# Altium footprint library Generic Footprint.PcbLib: 160 footprints (part 14 of 20) (continued)
## Symbol_FCC-Logo-1.5x1mm_silkscreen [mm] (continued)
1(0.677,0.644) 1(0.677,0.648) 1(0.677,0.649) 1(0.677,0.651) 1(0.677,0.894) 1(0.677,0.896) 1(0.677,0.898) 1(0.677,0.899) 1(0.678,0.178) 1(0.678,0.18) 1(0.678,0.422) 1(0.678,0.423) 1(0.678,0.427) 1(0.678,0.428) 1(0.678,0.43) 1(0.678,0.433) 1(0.678,0.435) 1(0.678,0.437) 1(0.678,0.639) 1(0.678,0.641) 1(0.678,0.643) 1(0.678,0.644) 1(0.678,0.648) 1(0.678,0.649) 1(0.678,0.653) 1(0.678,0.654) 1(0.678,0.656) 1(0.678,0.898) 1(0.678,0.899) 1(0.678,0.901) 1(0.68,0.175) 1(0.68,0.177) 1(0.68,0.178) 1(0.68,0.416) 1(0.68,0.418) 1(0.68,0.422) 1(0.68,0.423) 1(0.68,0.427) 1(0.68,0.428) 1(0.68,0.43) 1(0.68,0.648) 1(0.68,0.649) 1(0.68,0.653) 1(0.68,0.654) 1(0.68,0.656) 1(0.68,0.658) 1(0.68,0.659) 1(0.68,0.661) 1(0.68,0.663) 1(0.68,0.899) 1(0.68,0.903) 1(0.682,0.172) 1(0.682,0.173) 1(0.682,0.175) 1(0.682,0.177) 1(0.682,0.416) 1(0.682,0.418) 1(0.682,0.42) 1(0.682,0.422) 1(0.682,0.423) 1(0.682,0.653) 1(0.682,0.654) 1(0.682,0.656) 1(0.682,0.659) 1(0.682,0.661) 1(0.682,0.663) 1(0.682,0.904) 1(0.683,0.17) 1(0.683,0.175) 1(0.683,0.415) 1(0.683,0.416) 1(0.683,0.661) 1(0.683,0.906) 1(0.685,0.168) 1(0.685,0.172) 1(0.685,0.403) 1(0.685,0.418) 1(0.685,0.659) 1(0.685,0.663) 1(0.685,0.675) 1(0.685,0.908) 1(0.687,0.17) 1(0.687,0.172) 1(0.687,0.396) 1(0.687,0.398) 1(0.687,0.399) 1(0.687,0.403) 1(0.687,0.408) 1(0.687,0.41) 1(0.687,0.411) 1(0.687,0.413) 1(0.687,0.665) 1(0.687,0.666) 1(0.687,0.668) 1(0.687,0.675) 1(0.687,0.678) 1(0.687,0.68) 1(0.687,0.682) 1(0.687,0.908) 1(0.687,0.909) 1(0.688,0.166) 1(0.688,0.168) 1(0.688,0.17) 1(0.688,0.393) 1(0.688,0.396) 1(0.688,0.398) 1(0.688,0.399) 1(0.688,0.403) 1(0.688,0.405) 1(0.688,0.406) 1(0.688,0.67) 1(0.688,0.671) 1(0.688,0.673) 1(0.688,0.675) 1(0.688,0.678) 1(0.688,0.68) 1(0.688,0.682) 1(0.688,0.683) 1(0.688,0.685) 1(0.688,0.908) 1(0.688,0.909) 1(0.688,0.911) 1(0.69,0.163) 1(0.69,0.165) 1(0.69,0.166) 1(0.69,0.168) 1(0.69,0.388) 1(0.69,0.389) 1(0.69,0.391) 1(0.69,0.393) 1(0.69,0.396) 1(0.69,0.399) 1(0.69,0.401) 1(0.69,0.677) 1(0.69,0.678) 1(0.69,0.682) 1(0.69,0.683) 1(0.69,0.685) 1(0.69,0.687) 1(0.69,0.688) 1(0.69,0.909) 1(0.69,0.911) 1(0.69,0.913) 1(0.69,0.915) 1(0.692,0.165) 1(0.692,0.393) 1(0.692,0.394) 1(0.692,0.398) 1(0.692,0.68) 1(0.692,0.683) 1(0.692,0.69) 1(0.692,0.911) 1(0.693,0.163) 1(0.693,0.165) 1(0.693,0.166) 1(0.693,0.382) 1(0.693,0.384) 1(0.693,0.386) 1(0.693,0.389) 1(0.693,0.685) 1(0.693,0.688) 1(0.693,0.692) 1(0.693,0.694) 1(0.693,0.695) 1(0.693,0.916) 1(0.695,0.161) 1(0.695,0.381) 1(0.695,0.384) 1(0.695,0.389) 1(0.695,0.688) 1(0.695,0.694) 1(0.695,0.695) 1(0.695,0.697) 1(0.695,0.699) 1(0.695,0.918) 1(0.697,0.16) 1(0.697,0.161) 1(0.697,0.163) 1(0.697,0.377) 1(0.697,0.381) 1(0.697,0.384) 1(0.697,0.694) 1(0.697,0.695) 1(0.697,0.697) 1(0.697,0.699) 1(0.697,0.7) 1(0.699,0.158) 1(0.699,0.16) 1(0.699,0.161) 1(0.699,0.377) 1(0.699,0.379) 1(0.699,0.381) 1(0.699,0.697) 1(0.699,0.699) 1(0.699,0.7) 1(0.699,0.92) 1(0.7,0.156) 1(0.7,0.158) 1(0.7,0.16) 1(0.7,0.369) 1(0.7,0.374) 1(0.7,0.376) 1(0.7,0.377) 1(0.7,0.7) 1(0.7,0.709) 1(0.7,0.921) 1(0.702,0.153) 1(0.702,0.155) 1(0.702,0.156) 1(0.702,0.369) 1(0.702,0.702) 1(0.702,0.704) 1(0.702,0.709) 1(0.702,0.712) 1(0.702,0.714) 1(0.702,0.92) 1(0.702,0.921) 1(0.702,0.923) 1(0.704,0.151) 1(0.704,0.155) 1(0.704,0.156) 1(0.704,0.158) 1(0.704,0.362) 1(0.704,0.364) 1(0.704,0.369) 1(0.704,0.371) 1(0.704,0.372) 1(0.704,0.705) 1(0.704,0.707) 1(0.704,0.709) 1(0.704,0.712) 1(0.704,0.716) 1(0.704,0.717) 1(0.704,0.92) 1(0.704,0.921) 1(0.704,0.923) 1(0.704,0.925) 1(0.705,0.153) 1(0.705,0.155) 1(0.705,0.359) 1(0.705,0.36) 1(0.705,0.362) 1(0.705,0.364) 1(0.705,0.365) 1(0.705,0.367) 1(0.705,0.711) 1(0.705,0.712) 1(0.705,0.714) 1(0.705,0.716) 1(0.705,0.717) 1(0.705,0.719) 1(0.705,0.923) 1(0.705,0.925) 1(0.705,0.926) 1(0.707,0.15) 1(0.707,0.151) 1(0.707,0.153) 1(0.707,0.354) 1(0.707,0.355) 1(0.707,0.357) 1(0.707,0.359) 1(0.707,0.36) 1(0.707,0.362) 1(0.707,0.714) 1(0.707,0.716) 1(0.707,0.717) 1(0.707,0.719) 1(0.707,0.721) 1(0.707,0.722) 1(0.707,0.925) 1(0.707,0.928) 1(0.709,0.36) 1(0.709,0.364) 1(0.709,0.719) 1(0.709,0.721) 1(0.709,0.724) 1(0.709,0.926) 1(0.709,0.93) 1(0.711,0.148) 1(0.711,0.151) 1(0.711,0.35) 1(0.711,0.352) 1(0.711,0.355) 1(0.711,0.359) 1(0.711,0.721) 1(0.711,0.722) 1(0.711,0.726) 1(0.711,0.728) 1(0.711,0.926) 1(0.711,0.932) 1(0.712,0.146) 1(0.712,0.148) 1(0.712,0.15) 1(0.712,0.35) 1(0.712,0.355) 1(0.712,0.722) 1(0.712,0.726) 1(0.712,0.728) 1(0.712,0.729) 1(0.712,0.731) 1(0.714,0.144) 1(0.714,0.146) 1(0.714,0.15) 1(0.714,0.345) 1(0.714,0.35) 1(0.714,0.726) 1(0.714,0.728) 1(0.714,0.729) 1(0.714,0.731) 1(0.714,0.933) 1(0.716,0.143) 1(0.716,0.144) 1(0.716,0.146) 1(0.716,0.148) 1(0.716,0.345) 1(0.716,0.348) 1(0.716,0.729) 1(0.716,0.731) 1(0.716,0.933) 1(0.716,0.935) 1(0.717,0.141) 1(0.717,0.143) 1(0.717,0.338) 1(0.717,0.34) 1(0.717,0.347) 1(0.717,0.935) 1(0.717,0.937) 1(0.719,0.139) 1(0.719,0.144) 1(0.719,0.336) 1(0.719,0.34) 1(0.719,0.343) 1(0.719,0.345) 1(0.719,0.733) 1(0.719,0.734) 1(0.719,0.738) 1(0.719,0.739) 1(0.719,0.741) 1(0.719,0.933) 1(0.721,0.143) 1(0.721,0.333) 1(0.721,0.335) 1(0.721,0.336) 1(0.721,0.338) 1(0.721,0.34) 1(0.721,0.342) 1(0.721,0.736) 1(0.721,0.739) 1(0.721,0.741) 1(0.721,0.743) 1(0.721,0.744) 1(0.721,0.746) 1(0.722,0.136) 1(0.722,0.138) 1(0.722,0.139) 1(0.722,0.141) 1(0.722,0.33) 1(0.722,0.331) 1(0.722,0.333) 1(0.722,0.336) 1(0.722,0.338) 1(0.722,0.739) 1(0.722,0.741) 1(0.722,0.743) 1(0.722,0.744) 1(0.722,0.748) 1(0.722,0.935) 1(0.722,0.937) 1(0.722,0.94) 1(0.724,0.138) 1(0.724,0.139) 1(0.724,0.141) 1(0.724,0.328) 1(0.724,0.331) 1(0.724,0.333) 1(0.724,0.743) 1(0.724,0.744) 1(0.724,0.748) 1(0.724,0.75) 1(0.724,0.937) 1(0.724,0.938) 1(0.724,0.94) 1(0.724,0.942) 1(0.726,0.134) 1(0.726,0.136) 1(0.726,0.942) 1(0.726,0.943) 1(0.727,0.138) 1(0.727,0.328) 1(0.727,0.331) 1(0.727,0.748) 1(0.727,0.75) 1(0.727,0.94) 1(0.727,0.945) 1(0.729,0.132) 1(0.729,0.136) 1(0.729,0.328) 1(0.729,0.515) 1(0.729,0.517) 1(0.729,0.518) 1(0.729,0.52) 1(0.729,0.522) 1(0.729,0.524) 1(0.729,0.525) 1(0.729,0.527) 1(0.729,0.529) 1(0.729,0.53) 1(0.729,0.532) 1(0.729,0.534) 1(0.729,0.535) 1(0.729,0.537) 1(0.729,0.539) 1(0.729,0.54) 1(0.729,0.542) 1(0.729,0.544) 1(0.729,0.546) 1(0.729,0.547) 1(0.729,0.549) 1(0.729,0.551) 1(0.729,0.552) 1(0.729,0.554) 1(0.729,0.556) 1(0.729,0.558) 1(0.729,0.559) 1(0.729,0.561) 1(0.729,0.563) 1(0.729,0.75) 1(0.729,0.751) 1(0.729,0.753) 1(0.729,0.756) 1(0.729,0.942) 1(0.729,0.943) 1(0.731,0.131) 1(0.731,0.132) 1(0.731,0.134) 1(0.731,0.32) 1(0.731,0.323) 1(0.731,0.325) 1(0.731,0.326) 1(0.731,0.498) 1(0.731,0.5) 1(0.731,0.501) 1(0.731,0.503) 1(0.731,0.505) 1(0.731,0.507) 1(0.731,0.508) 1(0.731,0.51) 1(0.731,0.515) 1(0.731,0.517) 1(0.731,0.518) 1(0.731,0.52) 1(0.731,0.522) 1(0.731,0.524) 1(0.731,0.525) 1(0.731,0.527) 1(0.731,0.529) 1(0.731,0.53) 1(0.731,0.532) 1(0.731,0.534) 1(0.731,0.535) 1(0.731,0.537) 1(0.731,0.539) 1(0.731,0.54) 1(0.731,0.542) 1(0.731,0.544) 1(0.731,0.546) 1(0.731,0.547) 1(0.731,0.549) 1(0.731,0.551) 1(0.731,0.552) 1(0.731,0.554) 1(0.731,0.556) 1(0.731,0.558) 1(0.731,0.559) 1(0.731,0.561) 1(0.731,0.563) 1(0.731,0.568) 1(0.731,0.569) 1(0.731,0.571) 1(0.731,0.573) 1(0.731,0.575) 1(0.731,0.576) 1(0.731,0.578) 1(0.731,0.58) 1(0.731,0.756) 1(0.731,0.758) 1(0.731,0.943) 1(0.731,0.947) 1(0.733,0.127) 1(0.733,0.129) 1(0.733,0.131) 1(0.733,0.134) 1(0.733,0.32) 1(0.733,0.486) 1(0.733,0.488) 1(0.733,0.49) 1(0.733,0.491) 1(0.733,0.493) 1(0.733,0.498) 1(0.733,0.5) 1(0.733,0.501) 1(0.733,0.503) 1(0.733,0.505) 1(0.733,0.507) 1(0.733,0.508) 1(0.733,0.51) 1(0.733,0.513) 1(0.733,0.515) 1(0.733,0.517) 1(0.733,0.518) 1(0.733,0.52) 1(0.733,0.522) 1(0.733,0.524) 1(0.733,0.525) 1(0.733,0.527) 1(0.733,0.529) 1(0.733,0.53) 1(0.733,0.532) 1(0.733,0.534) 1(0.733,0.535) 1(0.733,0.537) 1(0.733,0.539) 1(0.733,0.54) 1(0.733,0.542) 1(0.733,0.544) 1(0.733,0.546) 1(0.733,0.547) 1(0.733,0.549) 1(0.733,0.551) 1(0.733,0.552) 1(0.733,0.554) 1(0.733,0.556) 1(0.733,0.558) 1(0.733,0.559) 1(0.733,0.561) 1(0.733,0.563) 1(0.733,0.564) 1(0.733,0.568) 1(0.733,0.569) 1(0.733,0.571) 1(0.733,0.573) 1(0.733,0.575) 1(0.733,0.576) 1(0.733,0.578) 1(0.733,0.58) 1(0.733,0.583) 1(0.733,0.585) 1(0.733,0.586) 1(0.733,0.588) 1(0.733,0.59) 1(0.733,0.592) 1(0.733,0.755) 1(0.733,0.758) 1(0.733,0.762) 1(0.733,0.948) 1(0.734,0.132) 1(0.734,0.316) 1(0.734,0.318) 1(0.734,0.32) 1(0.734,0.321) 1(0.734,0.476) 1(0.734,0.478) 1(0.734,0.479) 1(0.734,0.481) 1(0.734,0.483) 1(0.734,0.484) 1(0.734,0.486) 1(0.734,0.495) 1(0.734,0.512) 1(0.734,0.592) 1(0.734,0.593) 1(0.734,0.595) 1(0.734,0.597) 1(0.734,0.598) 1(0.734,0.6) 1(0.734,0.756) 1(0.734,0.758) 1(0.734,0.763) 1(0.734,0.948) 1(0.734,0.95) 1(0.736,0.131) 1(0.736,0.311) 1(0.736,0.313) 1(0.736,0.467) 1(0.736,0.469) 1(0.736,0.471) 1(0.736,0.473) 1(0.736,0.474) 1(0.736,0.488) 1(0.736,0.49) 1(0.736,0.491) 1(0.736,0.493) 1(0.736,0.495) 1(0.736,0.496) 1(0.736,0.498) 1(0.736,0.5) 1(0.736,0.501) 1(0.736,0.503) 1(0.736,0.505) 1(0.736,0.507) 1(0.736,0.508) 1(0.736,0.51) 1(0.736,0.566) 1(0.736,0.568) 1(0.736,0.569) 1(0.736,0.571) 1(0.736,0.573) 1(0.736,0.575) 1(0.736,0.576) 1(0.736,0.578) 1(0.736,0.58) 1(0.736,0.581) 1(0.736,0.583) 1(0.736,0.585) 1(0.736,0.586) 1(0.736,0.588) 1(0.736,0.59) 1(0.736,0.602) 1(0.736,0.603) 1(0.736,0.605) 1(0.736,0.607) 1(0.736,0.609) 1(0.736,0.61) 1(0.736,0.76) 1(0.736,0.762) 1(0.736,0.763) 1(0.736,0.765) 1(0.736,0.767) 1(0.736,0.952) 1(0.738,0.126) 1(0.738,0.309) 1(0.738,0.311) 1(0.738,0.313) 1(0.738,0.314) 1(0.738,0.461) 1(0.738,0.462) 1(0.738,0.464) 1(0.738,0.466) 1(0.738,0.478) 1(0.738,0.481) 1(0.738,0.486) 1(0.738,0.488) 1(0.738,0.49) 1(0.738,0.491) 1(0.738,0.493) 1(0.738,0.495) 1(0.738,0.583) 1(0.738,0.585) 1(0.738,0.586) 1(0.738,0.588) 1(0.738,0.59) 1(0.738,0.592) 1(0.738,0.597) 1(0.738,0.6) 1(0.738,0.612) 1(0.738,0.614) 1(0.738,0.615) 1(0.738,0.617) 1(0.738,0.762) 1(0.738,0.763) 1(0.738,0.767) 1(0.738,0.768) 1(0.739,0.124) 1(0.739,0.306) 1(0.739,0.308) 1(0.739,0.311) 1(0.739,0.313) 1(0.739,0.455) 1(0.739,0.457) 1(0.739,0.459) 1(0.739,0.461) 1(0.739,0.462) 1(0.739,0.478) 1(0.739,0.481) 1(0.739,0.597) 1(0.739,0.6) 1(0.739,0.614) 1(0.739,0.617) 1(0.739,0.619) 1(0.739,0.62) 1(0.739,0.622) 1(0.739,0.768) 1(0.739,0.77) 1(0.739,0.948) 1(0.739,0.95) 1(0.739,0.954) 1(0.741,0.122) 1(0.741,0.126) 1(0.741,0.308) 1(0.741,0.449) 1(0.741,0.455) 1(0.741,0.461) 1(0.741,0.462) 1(0.741,0.614) 1(0.741,0.617) 1(0.741,0.619) 1(0.741,0.62) 1(0.741,0.622) 1(0.741,0.624) 1(0.741,0.629) 1(0.741,0.767) 1(0.741,0.77) 1(0.741,0.772) 1(0.741,0.95) 1(0.741,0.952) 1(0.741,0.955) 1(0.743,0.304) 1(0.743,0.306) 1(0.743,0.308) 1(0.743,0.447) 1(0.743,0.45) 1(0.743,0.452) 1(0.743,0.624) 1(0.743,0.626) 1(0.743,0.627) 1(0.743,0.768) 1(0.743,0.772) 1(0.743,0.952) 1(0.743,0.954) 1(0.743,0.957) 1(0.745,0.121) 1(0.745,0.126) 1(0.745,0.304) 1(0.745,0.306) 1(0.745,0.442) 1(0.745,0.444) 1(0.745,0.445) 1(0.745,0.447) 1(0.745,0.449) 1(0.745,0.45) 1(0.745,0.452) 1(0.745,0.454) 1(0.745,0.455) 1(0.745,0.619) 1(0.745,0.62) 1(0.745,0.622) 1(0.745,0.624) 1(0.745,0.626) 1(0.745,0.627) 1(0.745,0.629) 1(0.745,0.632) 1(0.745,0.634) 1(0.745,0.636) 1(0.745,0.77) 1(0.746,0.119) 1(0.746,0.121) 1(0.746,0.122) 1(0.746,0.297) 1(0.746,0.299) 1(0.746,0.304) 1(0.746,0.433) 1(0.746,0.435) 1(0.746,0.437) 1(0.746,0.439) 1(0.746,0.442) 1(0.746,0.444) 1(0.746,0.447) 1(0.746,0.449) 1(0.746,0.45) 1(0.746,0.452) 1(0.746,0.626) 1(0.746,0.627) 1(0.746,0.629) 1(0.746,0.631) 1(0.746,0.632) 1(0.746,0.634) 1(0.746,0.636) 1(0.746,0.639) 1(0.746,0.641) 1(0.746,0.643) 1(0.746,0.772) 1(0.746,0.773) 1(0.746,0.779) 1(0.746,0.954) 1(0.746,0.959) 1(0.748,0.296) 1(0.748,0.299) 1(0.748,0.301) 1(0.748,0.303) 1(0.748,0.427) 1(0.748,0.432) 1(0.748,0.433) 1(0.748,0.435) 1(0.748,0.437) 1(0.748,0.439) 1(0.748,0.442) 1(0.748,0.444) 1(0.748,0.632) 1(0.748,0.634) 1(0.748,0.636) 1(0.748,0.639) 1(0.748,0.641) 1(0.748,0.643) 1(0.748,0.644) 1(0.748,0.646) 1(0.748,0.649) 1(0.748,0.651) 1(0.748,0.775) 1(0.748,0.779) 1(0.748,0.78) 1(0.748,0.782) 1(0.748,0.96) 1(0.75,0.117) 1(0.75,0.119) 1(0.75,0.121) 1(0.75,0.122) 1(0.75,0.294) 1(0.75,0.297) 1(0.75,0.299) 1(0.75,0.422) 1(0.75,0.428) 1(0.75,0.43) 1(0.75,0.432) 1(0.75,0.435) 1(0.75,0.437) 1(0.75,0.439) 1(0.75,0.44) 1(0.75,0.637) 1(0.75,0.639) 1(0.75,0.641) 1(0.75,0.643) 1(0.75,0.644) 1(0.75,0.646) 1(0.75,0.777) 1(0.75,0.78) 1(0.75,0.959) 1(0.751,0.116) 1(0.751,0.292) 1(0.751,0.296) 1(0.751,0.423) 1(0.751,0.425) 1(0.751,0.653) 1(0.751,0.654) 1(0.751,0.656) 1(0.751,0.779) 1(0.751,0.782) 1(0.751,0.784) 1(0.751,0.785) 1(0.751,0.962) 1(0.753,0.114) 1(0.753,0.117) 1(0.753,0.119) 1(0.753,0.291) 1(0.753,0.292) 1(0.753,0.294) 1(0.753,0.296) 1(0.753,0.297) 1(0.753,0.416) 1(0.753,0.418) 1(0.753,0.42) 1(0.753,0.432) 1(0.753,0.433) 1(0.753,0.644) 1(0.753,0.646) 1(0.753,0.648) 1(0.753,0.658) 1(0.753,0.659) 1(0.753,0.78) 1(0.753,0.782) 1(0.753,0.785) 1(0.753,0.959) 1(0.755,0.112) 1(0.755,0.116) 1(0.755,0.117) 1(0.755,0.287) 1(0.755,0.292) 1(0.755,0.294) 1(0.755,0.415) 1(0.755,0.418) 1(0.755,0.659) 1(0.755,0.661) 1(0.755,0.663) 1(0.755,0.785) 1(0.755,0.789) 1(0.755,0.79) 1(0.755,0.964) 1(0.756,0.116) 1(0.756,0.286) 1(0.756,0.408) 1(0.756,0.41) 1(0.756,0.411) 1(0.756,0.415) 1(0.756,0.418) 1(0.756,0.659) 1(0.756,0.663) 1(0.756,0.666) 1(0.756,0.668) 1(0.756,0.67) 1(0.756,0.787) 1(0.756,0.789) 1(0.758,0.11) 1(0.758,0.287) 1(0.758,0.289) 1(0.758,0.405) 1(0.758,0.408) 1(0.758,0.41) 1(0.758,0.411) 1(0.758,0.413) 1(0.758,0.415) 1(0.758,0.663) 1(0.758,0.665) 1(0.758,0.666) 1(0.758,0.668) 1(0.758,0.67) 1(0.758,0.671) 1(0.758,0.79) 1(0.758,0.964) 1(0.758,0.966) 1(0.758,0.967) 1(0.76,0.109) 1(0.76,0.286) 1(0.76,0.406) 1(0.76,0.411) 1(0.76,0.67) 1(0.76,0.789) 1(0.76,0.966) 1(0.762,0.282) 1(0.762,0.287) 1(0.762,0.398) 1(0.762,0.401) 1(0.762,0.405) 1(0.762,0.406) 1(0.762,0.408) 1(0.762,0.41) 1(0.762,0.666) 1(0.762,0.668) 1(0.762,0.671) 1(0.762,0.675) 1(0.762,0.677) 1(0.762,0.68) 1(0.762,0.79) 1(0.762,0.796) 1(0.762,0.964) 1(0.762,0.967) 1(0.762,0.969) 1(0.763,0.11) 1(0.763,0.279) 1(0.763,0.28) 1(0.763,0.282) 1(0.763,0.284) 1(0.763,0.286) 1(0.763,0.393) 1(0.763,0.394) 1(0.763,0.396) 1(0.763,0.401) 1(0.763,0.403) 1(0.763,0.405) 1(0.763,0.406) 1(0.763,0.671) 1(0.763,0.673) 1(0.763,0.677) 1(0.763,0.682) 1(0.763,0.683) 1(0.763,0.792) 1(0.763,0.794) 1(0.763,0.796) 1(0.763,0.797) 1(0.763,0.966) 1(0.765,0.107) 1(0.765,0.277) 1(0.765,0.28) 1(0.765,0.282) 1(0.765,0.391) 1(0.765,0.396) 1(0.765,0.398) 1(0.765,0.401) 1(0.765,0.677) 1(0.765,0.68) 1(0.765,0.682) 1(0.765,0.685) 1(0.765,0.687) 1(0.765,0.797) 1(0.765,0.799) 1(0.765,0.801) 1(0.765,0.967) 1(0.765,0.969) 1(0.765,0.971) 1(0.767,0.109) 1(0.767,0.11) 1(0.767,0.275) 1(0.767,0.279) 1(0.767,0.28) 1(0.767,0.389) 1(0.767,0.393) 1(0.767,0.396) 1(0.767,0.398) 1(0.767,0.399) 1(0.767,0.678) 1(0.767,0.68) 1(0.767,0.682) 1(0.767,0.688) 1(0.767,0.796) 1(0.767,0.799) 1(0.768,0.105) 1(0.768,0.107) 1(0.768,0.109) 1(0.768,0.274) 1(0.768,0.277) 1(0.768,0.279) 1(0.768,0.388) 1(0.768,0.393) 1(0.768,0.687) 1(0.768,0.797) 1(0.768,0.801) 1(0.768,0.802) 1(0.768,0.969) 1(0.768,0.971) 1(0.768,0.972) 1(0.77,0.104) 1(0.77,0.272) 1(0.77,0.275) 1(0.77,0.277) 1(0.77,0.384) 1(0.77,0.386) 1(0.77,0.388) 1(0.77,0.389) 1(0.77,0.687) 1(0.77,0.69) 1(0.77,0.692) 1(0.77,0.694) 1(0.77,0.799) 1(0.77,0.802) 1(0.77,0.804) 1(0.77,0.971) 1(0.77,0.974) 1(0.772,0.107) 1(0.772,0.27) 1(0.772,0.272) 1(0.772,0.274) 1(0.772,0.275) 1(0.772,0.381) 1(0.772,0.384) 1(0.772,0.388) 1(0.772,0.389) 1(0.772,0.692) 1(0.772,0.694) 1(0.772,0.697) 1(0.772,0.801) 1(0.772,0.802) 1(0.772,0.804) 1(0.772,0.976) 1(0.773,0.1) 1(0.773,0.102) 1(0.773,0.104) 1(0.773,0.274) 1(0.773,0.381) 1(0.773,0.382) 1(0.773,0.384) 1(0.773,0.692) 1(0.773,0.694) 1(0.773,0.697) 1(0.773,0.7) 1(0.773,0.702) 1(0.773,0.804) 1(0.775,0.102) 1(0.775,0.104) 1(0.775,0.27) 1(0.775,0.272) 1(0.775,0.376) 1(0.775,0.381) 1(0.775,0.695) 1(0.775,0.697) 1(0.775,0.7) 1(0.775,0.809) 1(0.775,0.977) 1(0.777,0.099) 1(0.777,0.267) 1(0.777,0.371) 1(0.777,0.372) 1(0.777,0.379) 1(0.777,0.699) 1(0.777,0.702) 1(0.777,0.705) 1(0.777,0.707) 1(0.777,0.806) 1(0.777,0.809) 1(0.777,0.811) 1(0.778,0.1) 1(0.778,0.102) 1(0.778,0.263) 1(0.778,0.265) 1(0.778,0.267) 1(0.778,0.27) 1(0.778,0.372) 1(0.778,0.376) 1(0.778,0.377) 1(0.778,0.7) 1(0.778,0.702) 1(0.778,0.704) 1(0.778,0.807) 1(0.778,0.813) 1(0.778,0.979) 1(0.78,0.1) 1(0.78,0.262) 1(0.78,0.265) 1(0.78,0.267) 1(0.78,0.269) 1(0.78,0.365) 1(0.78,0.367) 1(0.78,0.371) 1(0.78,0.374) 1(0.78,0.376) 1(0.78,0.705) 1(0.78,0.707) 1(0.78,0.709) 1(0.78,0.711) 1(0.78,0.712) 1(0.78,0.809) 1(0.78,0.811) 1(0.78,0.813) 1(0.78,0.814) 1(0.78,0.977) 1(0.78,0.981) 1(0.782,0.095) 1(0.782,0.097) 1(0.782,0.26) 1(0.782,0.263) 1(0.782,0.265) 1(0.782,0.364) 1(0.782,0.369) 1(0.782,0.371) 1(0.782,0.372) 1(0.782,0.705) 1(0.782,0.707) 1(0.782,0.714) 1(0.782,0.811) 1(0.782,0.813) 1(0.782,0.814) 1(0.782,0.816) 1(0.782,0.818) 1(0.782,0.977) 1(0.784,0.258) 1(0.784,0.262) 1(0.784,0.263) 1(0.784,0.36) 1(0.784,0.362) 1(0.784,0.716) 1(0.784,0.816) 1(0.784,0.979) 1(0.784,0.981) 1(0.784,0.983) 1(0.785,0.093) 1(0.785,0.26) 1(0.785,0.262) 1(0.785,0.359) 1(0.785,0.717) 1(0.785,0.719) 1(0.785,0.814) 1(0.785,0.818) 1(0.785,0.819) 1(0.787,0.258) 1(0.787,0.26) 1(0.787,0.357) 1(0.787,0.36) 1(0.787,0.362) 1(0.787,0.716) 1(0.787,0.717) 1(0.787,0.721) 1(0.787,0.816) 1(0.787,0.819) 1(0.787,0.979) 1(0.787,0.983) 1(0.787,0.984) 1(0.789,0.092) 1(0.789,0.095) 1(0.789,0.253) 1(0.789,0.255) 1(0.789,0.258) 1(0.789,0.359) 1(0.789,0.36) 1(0.789,0.362) 1(0.789,0.716) 1(0.789,0.717) 1(0.789,0.719) 1(0.789,0.818) 1(0.789,0.819) 1(0.789,0.981) 1(0.79,0.093) 1(0.79,0.095) 1(0.79,0.253) 1(0.79,0.255) 1(0.79,0.257) 1(0.79,0.35) 1(0.79,0.352) 1(0.79,0.357) 1(0.79,0.359) 1(0.79,0.719) 1(0.79,0.721) 1(0.79,0.724) 1(0.79,0.726) 1(0.79,0.821) 1(0.79,0.824) 1(0.79,0.983) 1(0.79,0.986) 1(0.792,0.255) 1(0.792,0.348) 1(0.792,0.352) 1(0.792,0.355) 1(0.792,0.357) 1(0.792,0.721) 1(0.792,0.722) 1(0.792,0.724) 1(0.792,0.726) 1(0.792,0.728) 1(0.792,0.824) 1(0.792,0.826) 1(0.792,0.988) 1(0.794,0.09) 1(0.794,0.092) 1(0.794,0.093) 1(0.794,0.354) 1(0.794,0.724) 1(0.794,0.729) 1(0.794,0.823) 1(0.794,0.826) 1(0.794,0.986) 1(0.796,0.248) 1(0.796,0.25) 1(0.796,0.253) 1(0.796,0.345) 1(0.796,0.347) 1(0.796,0.352) 1(0.796,0.726) 1(0.796,0.731) 1(0.796,0.733) 1(0.796,0.824) 1(0.796,0.989) 1(0.797,0.246) 1(0.797,0.25) 1(0.797,0.343) 1(0.797,0.347) 1(0.797,0.731) 1(0.797,0.734) 1(0.797,0.826) 1(0.797,0.83) 1(0.797,0.831) 1(0.797,0.986) 1(0.797,0.988) 1(0.797,0.991) 1(0.799,0.087) 1(0.799,0.088) 1(0.799,0.09) 1(0.799,0.092) 1(0.799,0.245) 1(0.799,0.248) 1(0.799,0.25) 1(0.799,0.251) 1(0.799,0.342) 1(0.799,0.343) 1(0.799,0.345) 1(0.799,0.347) 1(0.799,0.731) 1(0.799,0.733) 1(0.799,0.734) 1(0.799,0.736) 1(0.799,0.828) 1(0.799,0.83) 1(0.799,0.988) 1(0.801,0.085) 1(0.801,0.087) 1(0.801,0.088) 1(0.801,0.09) 1(0.801,0.243) 1(0.801,0.246) 1(0.801,0.248) 1(0.801,0.34) 1(0.801,0.342) 1(0.801,0.345) 1(0.801,0.733) 1(0.801,0.734) 1(0.801,0.736) 1(0.801,0.738) 1(0.801,0.83) 1(0.801,0.831) 1(0.801,0.833) 1(0.801,0.993) 1(0.802,0.087) 1(0.802,0.088) 1(0.802,0.245) 1(0.802,0.246) 1(0.802,0.338) 1(0.802,0.34) 1(0.802,0.343) 1(0.802,0.833) 1(0.802,0.835) 1(0.804,0.083) 1(0.804,0.243) 1(0.804,0.245) 1(0.804,0.338) 1(0.804,0.342) 1(0.804,0.736) 1(0.804,0.738) 1(0.804,0.741) 1(0.804,0.743) 1(0.804,0.831) 1(0.804,0.835) 1(0.806,0.24) 1(0.806,0.241) 1(0.806,0.331) 1(0.806,0.333) 1(0.806,0.335) 1(0.806,0.34) 1(0.806,0.738) 1(0.806,0.741) 1(0.806,0.743) 1(0.806,0.744) 1(0.806,0.833) 1(0.806,0.991) 1(0.806,0.994) 1(0.807,0.082) 1(0.807,0.241) 1(0.807,0.33) 1(0.807,0.333) 1(0.807,0.335) 1(0.807,0.336) 1(0.807,0.338) 1(0.807,0.739) 1(0.807,0.741) 1(0.807,0.743) 1(0.807,0.744) 1(0.807,0.746) 1(0.807,0.838) 1(0.807,0.991) 1(0.807,0.993) 1(0.809,0.24) 1(0.809,0.241) 1(0.809,0.243) 1(0.809,0.331) 1(0.809,0.333) 1(0.809,0.335) 1(0.809,0.744) 1(0.809,0.746) 1(0.809,0.748) 1(0.809,0.835) 1(0.809,0.838) 1(0.809,0.996) 1(0.811,0.08) 1(0.811,0.24) 1(0.811,0.328) 1(0.811,0.33) 1(0.811,0.75) 1(0.811,0.836) 1(0.811,0.841) 1(0.811,0.993) 1(0.811,0.994) 1(0.812,0.238) 1(0.812,0.326) 1(0.812,0.331) 1(0.812,0.746) 1(0.812,0.748) 1(0.812,0.751) 1(0.812,0.838) 1(0.812,0.841) 1(0.814,0.235) 